# Altium footprint library lib.PcbLib: 145 footprints (part 4 of 10)
Each footprint in its own frame and in the unit in brackets; x right, y up, seen from the top. Pads: shape width x height; smd on the part's side, far side on the other; paste and mask are expansions set on the pad; w line width, h text height; cw(c..) or ccw(c..) is an arc to the next point about the centre after c.
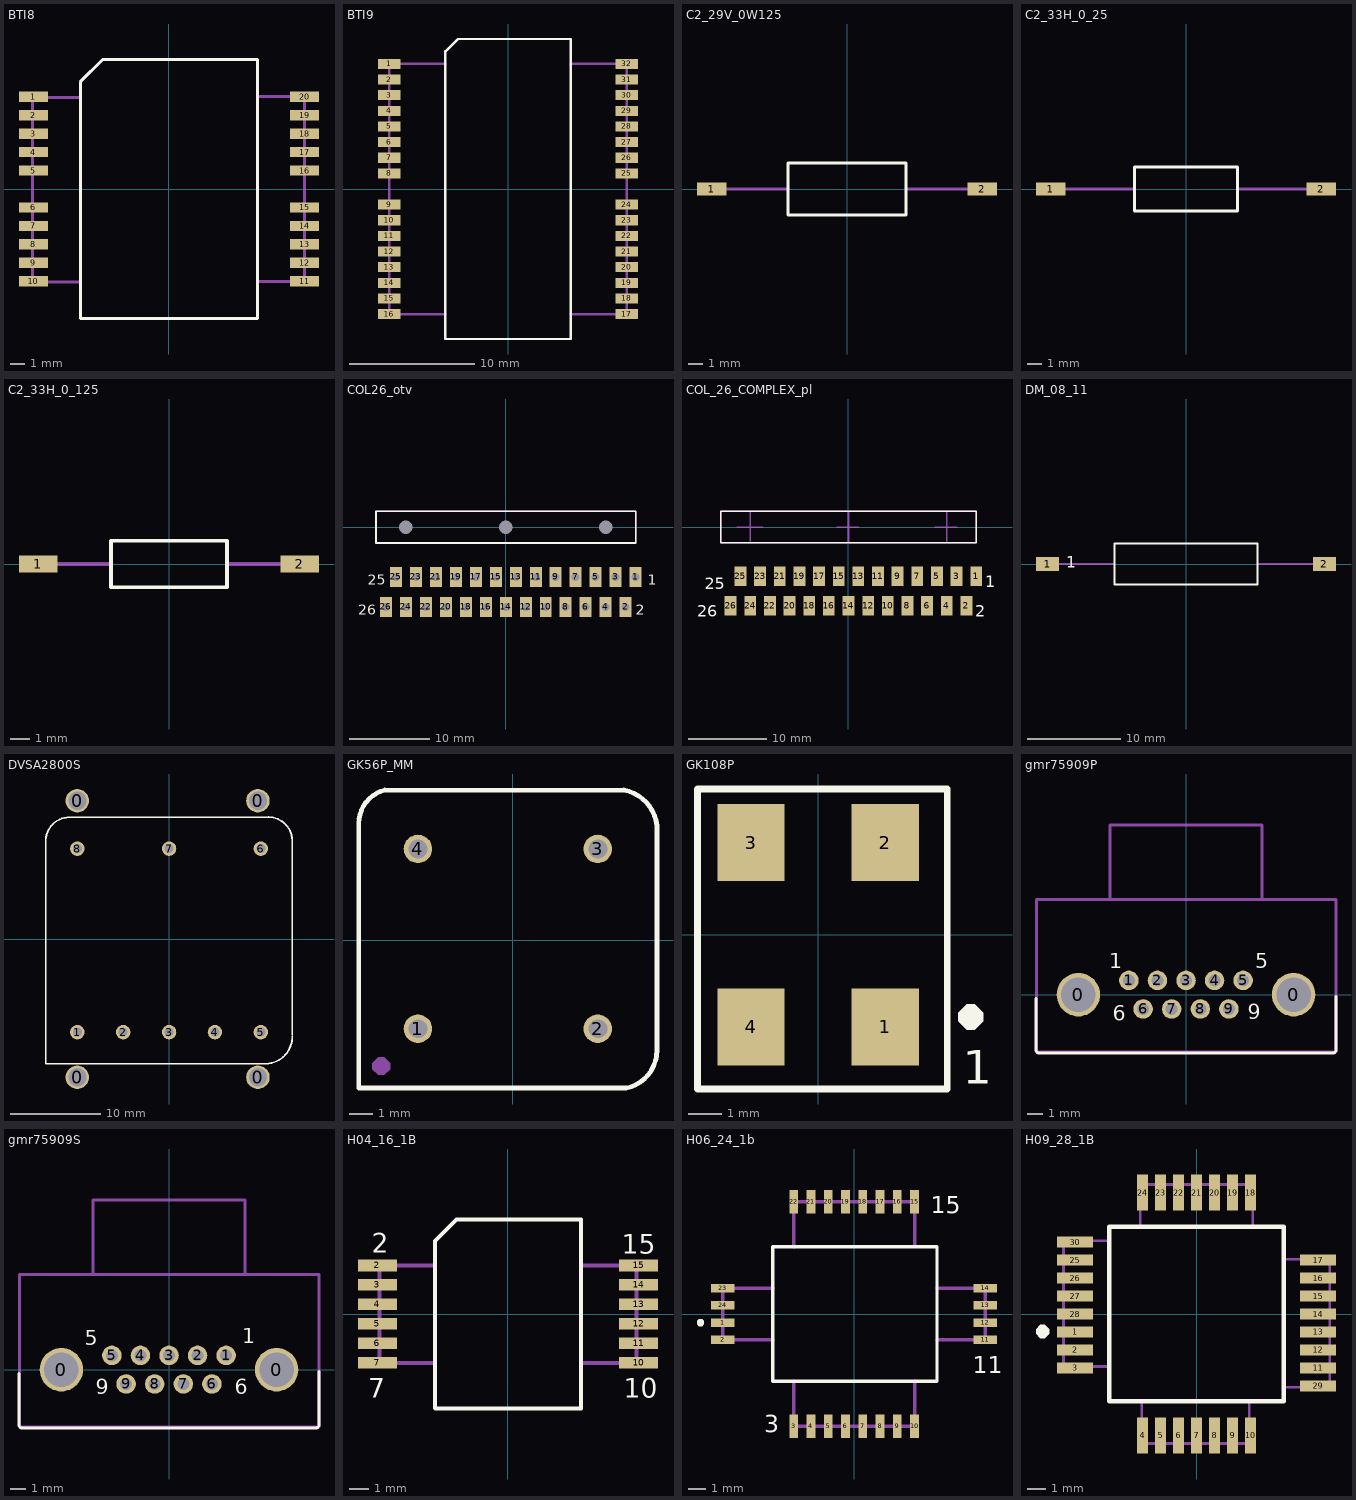
[diagram p3: the footprints below, top view; thin cyan lines are the x and y axes]

## BTI8 [mm] "2.8g"
height 4.5
pads (20):
  rect 1.95x0.7 smd: 1(-9.175,6.25) 2(-9.175,5) 3(-9.175,3.75) 4(-9.175,2.5) 5(-9.175,1.25) 6(-9.175,-1.25) 7(-9.175,-2.5) 8(-9.175,-3.75) 9(-9.175,-5) 10(-9.175,-6.25) 11(9.175,-6.25) 12(9.175,-5) 13(9.175,-3.75) 14(9.175,-2.5) 15(9.175,-1.25) 16(9.175,1.25) 17(9.175,2.5) 18(9.175,3.75) 19(9.175,5) 20(9.175,6.25)
Top Overlay:
  lines w0.2: -6,-8.75 6,-8.75 6,8.75 -4.5,8.75 -6,7.25 -6,-8.75
Mechanical 5:
  lines w0.2: -6,-6.3 -9.225,-6.3 -9.225,6.2 -6,6.2 ; 6.05,-6.25 9.175,-6.25 9.175,6.25 6.05,6.25
Mechanical 25:
  text "1" at -7.2,5.6 h2
  text "20" at 6.2,5.7 h2
  text "11" at 6.3,-6.7 h2
  text "10" at -7.9,-6.9 h2
3D body "bti8.stp": height 4.5, standoff 0, extent -9.65,-8.75 9.65,8.75

## BTI9 [mm] "inst 34 form 44.3023.193.26 massa 3 prokl -62"
height 4.5
pads (32):
  rect 1.8x0.8 smd: 1(-9.5,10) 2(-9.5,8.75) 3(-9.5,7.5) 4(-9.5,6.25) 5(-9.5,5) 6(-9.5,3.75) 7(-9.5,2.5) 8(-9.5,1.25) 9(-9.5,-1.25) 10(-9.5,-2.5) 11(-9.5,-3.75) 12(-9.5,-5) 13(-9.5,-6.25) 14(-9.5,-7.5) 15(-9.5,-8.75) 16(-9.5,-10) 17(9.5,-10) 18(9.5,-8.75) 19(9.5,-7.5) 20(9.5,-6.25) 21(9.5,-5) 22(9.5,-3.75) 23(9.5,-2.5) 24(9.5,-1.25) 25(9.5,1.25) 26(9.5,2.5) 27(9.5,3.75) 28(9.5,5) 29(9.5,6.25) 30(9.5,7.5) 31(9.5,8.75) 32(9.5,10)
Top Overlay:
  lines w0.2: -5,-12 -5,11 -4,12 5,12 5,-12 -5,-12
Mechanical 5:
  lines w0.2: -5,-10 -9.5,-10 -9.5,10 -5,10 ; 5,-10 9.5,-10 9.5,10 5,10
Mechanical 25:
  text "16" at -8.1,-10.4 h2
  text "17" at 6.6,-10.7 h2
  text "32" at 6.4,9.5 h2
  text "1" at -8,9.5 h2
3D body "bti9.stp": height 4.5, standoff 0, extent -9.65,-12 9.65,12

## C2_29V_0W125 [mm] "0.3"
height 3.5
pads (2):
  rect 2x0.9 smd: 1(-9.15,0) 2(9.15,0)
Top Overlay:
  lines w0.2: -4,-1.75 -4,1.75 4,1.75 4,-1.75 -4,-1.75
Mechanical 5:
  lines w0.2: -9.65,0 -4,0 ; 4,0 9.65,0
Mechanical 25:
  text "2" at 7.15,-0.675 h2
  text "1" at -7.925,-0.525 h2
3D body "s2_29v_0125.stp": height 3.5, standoff 0, extent -9.65,-1.75 9.65,1.75

## C2_33H_0_25 [mm] "m0.25g"
height 3
pads (2):
  rect 2x0.9 smd: 1(-9.15,0) 2(9.15,0)
Top Overlay:
  lines w0.2: -3.5,-1.5 3.5,-1.5 3.5,1.5 -3.5,1.5 -3.5,-1.5
Mechanical 5:
  lines w0.2: -9.65,0 -3.5,0 ; 3.5,0 9.65,0
Mechanical 25:
  text "1" at -7.925,-0.525 h2
  text "2" at 7.15,-0.675 h2
3D body "c2_33h_0250.stp": height 3, standoff -0.05, extent -9.65,-1.5 9.65,1.5

## C2_33H_0_125 [mm] "m0.15g"
height 2.2
pads (2):
  rect 2x0.9 smd: 1(-6.75,0) 2(6.75,0)
Top Overlay:
  lines w0.2: -3,-1.2 3,-1.2 3,1.2 -3,1.2 -3,-1.2
Mechanical 5:
  lines w0.2: -6.75,0 -3,0 ; 3,0 6.75,0
Mechanical 25:
  text "1" at -5.55,-0.525 h2
  text "2" at 4.7,-0.65 h2
3D body "c2_33h_0125.stp": height 2.2, standoff -0.01, extent -7.25,-1.1 7.25,1.1

## COL26_otv [mm]
height 5
pads (29):
  round 0 hole 1.7 unplated: 0(-12.5,0) 0(0,0) 0(12.5,0)
  rect 1.5x2.5 / inner round 1.5 / far side round 1.5 hole 1: 1(16.25,-6.25) 2(15,-10) 3(13.75,-6.25) 4(12.5,-10) 5(11.25,-6.25) 6(10,-10) 7(8.75,-6.25) 8(7.5,-10) 9(6.25,-6.25) 10(5,-10) 11(3.75,-6.25) 12(2.5,-10) 13(1.25,-6.25) 14(0,-10) 15(-1.25,-6.25) 16(-2.5,-10) 17(-3.75,-6.25) 18(-5,-10) 19(-6.25,-6.25) 20(-7.5,-10) 21(-8.75,-6.25) 22(-10,-10) 23(-11.25,-6.25) 24(-12.5,-10) 25(-13.75,-6.25) 26(-15,-10)
Top Overlay:
  lines w0.2: -16.25,-2 16.25,-2 16.25,2 -16.25,2 -16.25,-2
  text "1" at 17.75,-7.25 h1.3
  text "2" at 16.25,-11 h1.3
  text "26" at -18.5,-11 h1.3
  text "25" at -17.25,-7.25 h1.3
Top Solder:
  circle w1.2: c0,0 r0.508
  circle w1.2: c12.5,0 r0.5
  circle w1.2: c-12.5,0 r0.5
Bottom Solder:
  circle w1.2: c0,0 r0.5
  circle w1.2: c12.5,0 r0.5
  circle w1.2: c-12.5,0 r0.5
Mechanical 5:
  lines w0.2: -16.25,-2 -16.25,2 16.25,2 16.25,-2 -16.25,-2
Mechanical 25:
  text "26" at -18.5,-10.5 h1.3
  text "2" at 16.25,-10.75 h1.3
  text "1" at 17.75,-7 h1.3
  text "25" at -17.25,-6.75 h1.3

## COL_26_COMPLEX_pl [mm]
height 5
pads (26):
  rect 1.5x2.5 smd: 1(16.25,-6.25) 2(15,-10) 3(13.75,-6.25) 4(12.5,-10) 5(11.25,-6.25) 6(10,-10) 7(8.75,-6.25) 8(7.5,-10) 9(6.25,-6.25) 10(5,-10) 11(3.75,-6.25) 12(2.5,-10) 13(1.25,-6.25) 14(0,-10) 15(-1.25,-6.25) 16(-2.5,-10) 17(-3.75,-6.25) 18(-5,-10) 19(-6.25,-6.25) 20(-7.5,-10) 21(-8.75,-6.25) 22(-10,-10) 23(-11.25,-6.25) 24(-12.5,-10) 25(-13.75,-6.25) 26(-15,-10)
Top Overlay:
  lines w0.2: -16.25,-2 -16.25,0 -16.25,2 16.25,2 16.25,-2 -16.25,-2
  text "26" at -19.269,-11.388 h1.5
  text "2" at 16.137,-11.388 h1.5
  text "1" at 17.387,-7.638 h1.5
  text "25" at -18.3,-7.9 h1.5
Mechanical 5:
  lines w0.2: -14.2,0 -10.9,0 ; -12.5,-1.8 -12.5,2 ; -1.5,0 1.3,0 ; 0,-2 0,1.9 ; 11,0 13.8,0 ; 12.5,-1.8 12.5,2 ; -16.25,-2 16.25,-2 16.25,2 -16.25,2 -16.25,-2
Mechanical 25:
  text "26" at -19.269,-11.388 h2
  text "2" at 16.137,-11.388 h2
  text "1" at 17.387,-7.638 h2
  text "25" at -18.269,-7.888 h2

## DM_08_11 [mm] "m_1,2g;"
height 4.5
pads (2):
  rect 2.5x1.5 smd paste+0: 1(-14.9,0) 2(14.9,0)
Top Overlay:
  lines w0.2: -7.7,-2.2 7.7,-2.2 7.7,2.2 -7.7,2.2 -7.7,-2.2
  text "1" at -12.9,-0.4 h1.2
Mechanical 5:
  lines w0.2: -15.9,0 -7.8,0 ; 7.7,0 14.6,0
Mechanical 25:
  text "1" at -13.7,0.9 h1.2
  text "2" at 13.1,0.4 h1.2
3D body "dm.stp": height 4.4, standoff 0, extent -15.65,-2.2 15.65,2.2

## DVSA2800S [mm] "15g"
height 6.86
pads (12):
  round 2.6 hole 2: 0(-10.16,-15.312) 0(-10.16,15.313) 0(9.84,-15.312) 0(9.84,15.313)
  round 1.6 hole 1: 1(-10.16,-10.312) 2(-5.08,-10.312) 3(0,-10.312) 4(5.08,-10.312) 5(10.16,-10.312) 6(10.16,10.008) 7(0,10.008) 8(-10.16,10.008)
Top Overlay:
  lines w0.2: -13.66,10.688 cw(c-11.002,10.827) -11.06,13.488 10.74,13.488 cw(c10.998,10.853) 13.64,10.688 13.64,-10.612 ; -13.66,10.888 -13.66,-13.812 10.74,-13.812 ccw(c10.65,-10.822) 13.64,-10.712
Mechanical 25:
  text "1" at -12.68,-11.578 h2
  text "5" at 11.188,-11.578 h2
  text "8" at -12.312,8.722 h2
  text "6" at 10.988,8.622 h2

## GK56P_MM [mm]
pads (4):
  round 1.2 hole 0.8: 1(-4,-3.75) 2(3.6,-3.75) 3(3.6,3.85) 4(-4,3.85)
Top Overlay:
  lines w0.2: -6.5,4.94 cw(c-5.049,4.932) -5.4,6.34 4.7,6.33 ; -6.5,4.95 -6.5,-6.25 4.8,-6.25 ; 4.7,6.34 cw(c4.385,4.642) 6.1,4.84 6.1,-4.66 cw(c4.464,-4.659) 4.8,-6.26
Mechanical 5:
  region: -5.925,-5.45 -5.675,-5.7 -5.425,-5.7 -5.175,-5.45 -5.175,-5.2 -5.425,-4.95 -5.675,-4.95 -5.925,-5.2
Mechanical 17:
  region: -5.175,-5.2 -5.425,-4.95 -5.675,-4.95 -5.925,-5.2 -5.925,-5.45 -5.675,-5.7 -5.425,-5.7 -5.175,-5.45
Mechanical 25:
  text "1" at -4.4,-5.8 h2
  text "2" at 3.1,-5.8 h2
  text "3" at 3.2,1.8 h2
  text "4" at -4.6,1.7 h2

## GK108P [mm]
height 1.6
pads (4):
  rect 2x2.3 smd: 1(2,-2.75) 2(2,2.75) 3(-2,2.75) 4(-2,-2.75)
Top Overlay:
  region: 4.175,-2.575 4.425,-2.825 4.675,-2.825 4.925,-2.575 4.925,-2.325 4.675,-2.075 4.425,-2.075 4.175,-2.325
  lines w0.2: -3.6,-4.6 -3.6,4.35 3.85,4.35 3.85,-4.6 -3.6,-4.6
  text "1" at 4.318,-4.445 h1
Mechanical 25:
  text "3" at -4.4,2.2 h2
  text "2" at 3.7,2.3 h2
  text "4" at -4.6,-3.4 h2
  text "1" at 3.8,-3.3 h2
3D body: height 1, standoff 0, extent 2.5,2.1 2.6,2.9
3D body: height 1, standoff 0, extent 2.5,-3.05 2.6,-2.25
3D body: height 1, standoff 0, extent -2.6,-3.05 -2.5,-2.25
3D body: height 1, standoff 0, extent -2.6,2.1 -2.5,2.9
3D body: height 1.6, standoff 0, extent -2.5,-3.5 2.5,3.5

## gmr75909P [mm]
height 8
pads (11):
  round 2.9 hole 2.3: 0(-7.175,0) 0(7.175,0)
  round 1.3 hole 0.8: 1(-3.81,0.953) 2(-1.905,0.953) 3(0,0.953) 4(1.905,0.953) 5(3.81,0.953) 6(-2.857,-0.953) 7(-0.953,-0.953) 8(0.953,-0.953) 9(2.857,-0.953)
Top Overlay:
  lines w0.2: -10,-0.25 -10,-3.75 -9.875,-3.875 9.875,-3.875 10,-3.75 10,-0.125
  text "5" at 4.625,1.75 h1
  text "9" at 4.125,-1.625 h1
  text "1" at -5.125,1.75 h1
  text "6" at -4.875,-1.75 h1
Mechanical 5:
  lines w0.2: -5.08,6.43 -5.08,11.3 5.08,11.3 5.08,6.395 ; 9.97,6.35 -9.97,6.35 -9.97,-3.81 10,-3.81 10,6.35
Mechanical 25:
  text "1" at -5.5,1.625 h2
  text "5" at 4.625,1.625 h2
  text "9" at 4.125,-1.625 h2
  text "6" at -5,-1.75 h2

## gmr75909S [mm]
height 8
pads (11):
  round 2.9 hole 2.3: 0(-7.175,0) 0(7.175,0)
  round 1.3 hole 0.8: 1(3.81,0.953) 2(1.905,0.953) 3(0,0.953) 4(-1.905,0.953) 5(-3.81,0.953) 6(2.857,-0.953) 7(0.953,-0.949) 8(-0.953,-0.953) 9(-2.857,-0.953)
Top Overlay:
  lines w0.2: -10,-0.25 -10,-3.75 -9.875,-3.875 9.875,-3.875 10,-3.75 10,-0.125
  text "5" at -5.625,1.625 h1
  text "9" at -4.875,-1.625 h1
  text "1" at 4.875,1.75 h1
  text "6" at 4.375,-1.625 h1
Mechanical 5:
  lines w0.2: -5.08,6.43 -5.08,11.3 5.08,11.3 5.08,6.395 ; 9.97,6.35 -9.97,6.35 -9.97,-3.81 10,-3.81 10,6.35
Mechanical 25:
  text "1" at 4.5,1.625 h2
  text "5" at -5.625,1.5 h2
  text "9" at -4.875,-1.625 h2
  text "6" at 4.25,-1.625 h2

## H04_16_1B [mm] "крыло чайки ОСТ 11 073.063-84,m<1g"
height 3
pads (12):
  rect 2x0.6 smd: 2(-6.7,2.5) 3(-6.7,1.5) 4(-6.7,0.5) 5(-6.7,-0.5) 6(-6.7,-1.5) 7(-6.7,-2.5) 10(6.7,-2.5) 11(6.7,-1.5) 12(6.7,-0.5) 13(6.7,0.5) 14(6.7,1.5) 15(6.7,2.5)
Top Overlay:
  lines w0.2: -2.637,4.862 -3.75,3.75 -3.75,3.35 -3.75,-4.825 -3.725,-4.85 3.75,-4.85 3.75,4.85 -2.6,4.85
  text "10" at 5.95,-4.3 h1
  text "15" at 5.85,3.1 h1
  text "7" at -7.175,-4.3 h1
  text "2" at -7,3.15 h1
Mechanical 5:
  lines w0.2: -3.8,-2.5 -6.6,-2.5 -6.6,2.5 -3.8,2.5 ; 3.8,-2.5 6.6,-2.5 6.6,2.5 3.8,2.5
Mechanical 25:
  text "10" at 3.8,-3.125 h2
  text "7" at -5.175,-3.075 h2
  text "2" at -5.125,1.825 h2
  text "15" at 3.7,1.775 h2
3D body "H04_16_1B.stp": height 3.9, standoff 0, extent -7.25,-4.3 7.25,4.3

## H06_24_1b [mm]
height 3
pads (24):
  rect 1.35x0.5 smd: 1(-7.6,-0.5) 2(-7.6,-1.5) 11(7.6,-1.5) 12(7.6,-0.5) 13(7.6,0.5) 14(7.6,1.5) 23(-7.6,1.5) 24(-7.6,0.5)
  rect 0.5x1.35 smd: 3(-3.5,-6.5) 4(-2.5,-6.5) 5(-1.5,-6.5) 6(-0.5,-6.5) 7(0.5,-6.5) 8(1.5,-6.5) 9(2.5,-6.5) 10(3.5,-6.5) 15(3.5,6.5) 16(2.5,6.5) 17(1.5,6.5) 18(0.5,6.5) 19(-0.5,6.5) 20(-1.5,6.5) 21(-2.5,6.5) 22(-3.5,6.5)
Top Overlay:
  region: -9,-0.3 -8.8,-0.3 -8.7,-0.4 -8.7,-0.6 -8.8,-0.7 -9,-0.7 -9.1,-0.6 -9.1,-0.4
  lines w0.2: -4.7,-3.9 -4.7,3.9 4.8,3.9 4.8,-3.9 -4.7,-3.9
  text "3" at -5.207,-6.858 h1
  text "11" at 6.858,-3.429 h1
  text "15" at 4.445,5.842 h1
Mechanical 5:
  lines w0.2: -4.7,-1.5 -7.6,-1.5 -7.6,1.5 -4.7,1.5 ; -3.5,-3.9 -3.5,-6.5 3.5,-6.5 3.5,-3.9 ; -3.5,3.9 -3.5,6.5 3.5,6.5 3.5,4 ; 4.8,-1.5 7.6,-1.5 7.6,1.5 4.8,1.5
3D body "h06_24_1b.stp": height 3.4, standoff 0, extent -7.9,-6.8 7.9,6.8

## H09_28_1B [mm] "44u.3267.145             H5503XM1-289"
height 3
pads (30):
  rect 2x0.6 smd: 1(-6.75,-1) 2(-6.75,-2) 3(-6.75,-3) 11(6.75,-3) 12(6.75,-2) 13(6.75,-1) 14(6.75,0) 15(6.75,1) 16(6.75,2) 17(6.75,3) 25(-6.75,3) 26(-6.75,2) 27(-6.75,1) 28(-6.75,0) 29(6.75,-4) 30(-6.75,4)
  rect 0.6x2 smd: 4(-3,-6.75) 5(-2,-6.75) 6(-1,-6.75) 7(0,-6.75) 8(1,-6.75) 9(2,-6.75) 10(3,-6.75) 18(3,6.75) 19(2,6.75) 20(1,6.75) 21(0,6.75) 22(-1,6.75) 23(-2,6.75) 24(-3,6.75)
Top Overlay:
  region: -8.925,-1.11 -8.675,-1.36 -8.425,-1.36 -8.175,-1.11 -8.175,-0.86 -8.425,-0.61 -8.675,-0.61 -8.925,-0.86
  lines w0.25: -4.85,-4.85 -4.85,4.85 4.85,4.85 4.85,-4.85 -4.85,-4.85
Mechanical 5:
  lines w0.15: -5,4.064 -7.4,4.064 -7.4,-2.921 -4.875,-2.921 ; -3.125,4.875 -3.125,7.2 3.13,7.2 3.13,4.875 ; -3.048,-4.875 -3.048,-7.2 2.921,-7.2 2.921,-4.875 ; 4.875,-4.064 7.4,-4.064 7.4,3.048 4.875,3.048
  text "TP2" at 5.989,-5.423 h1.5
  text "TP1" at -8.411,4.577 h1.5
Mechanical 25:
  text "1" at -5.6,-1.6 h1.8
  text "4" at -3.7,-5.4 h1.8
  text "25" at -5.375,2.425 h1.8
  text "17" at 3.6,2.4 h1.8
  text "24" at -3.725,4.35 h1.8
  text "11" at 3.675,-3.55 h1.8
  text "10" at 2.325,-5.475 h1.8
  text "18" at 2.025,4.225 h1.8
  text "30" at -7.65,4.65 h1.8
  text "29" at 5.725,-5.8 h1.8
3D body "h09_28_1b.stp": height 3.81, standoff 0, extent -7.25,-7.25 7.25,7.25